# Altium footprint library 接插件封装库.PcbLib: 112 footprints (part 5 of 7)
Each footprint in its own frame and in the unit in brackets; x right, y up, seen from the top. Pads: shape width x height; smd on the part's side, far side on the other; paste and mask are expansions set on the pad; w line width, h text height; cw(c..) or ccw(c..) is an arc to the next point about the centre after c.
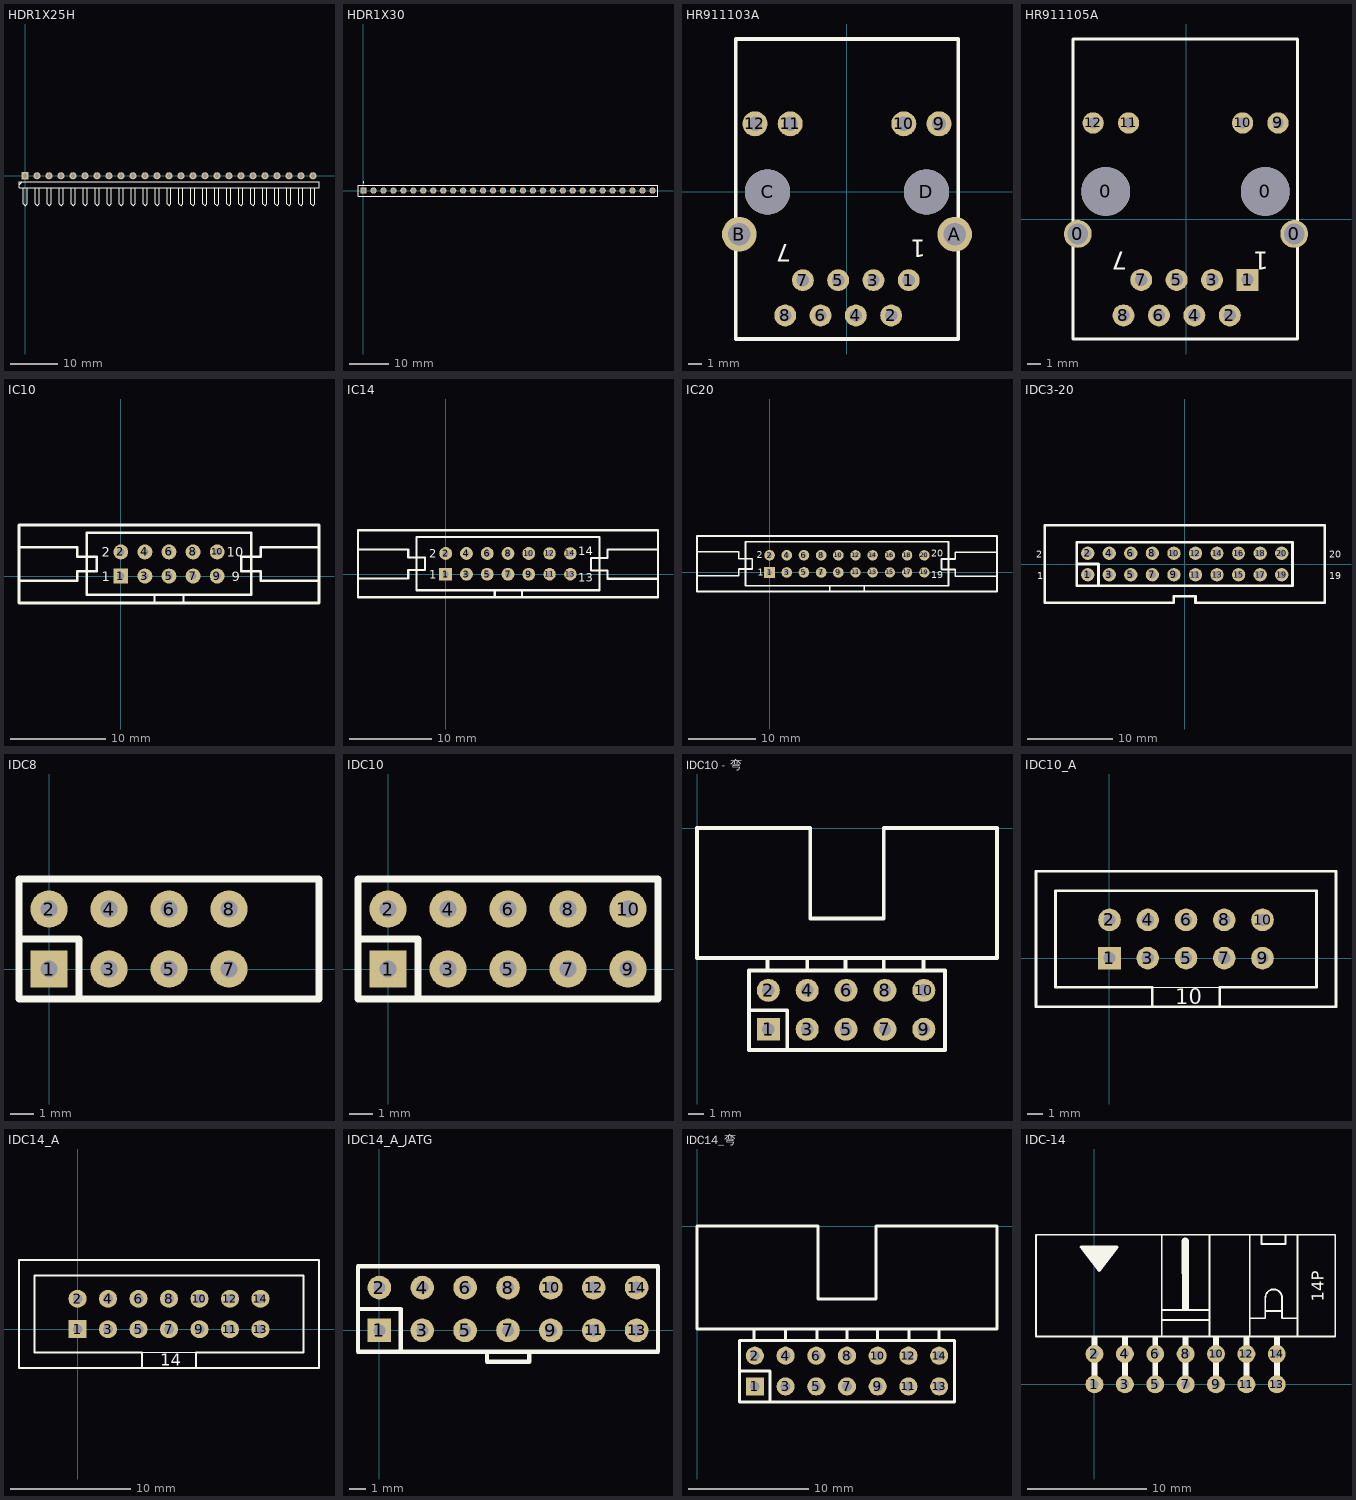
[diagram p4: the footprints below, top view; thin cyan lines are the x and y axes]

## HDR1X25H [mm] "Connector; Header; 25 Position; Right Angle"
pads (25):
  rect 1.5x1.5 hole 0.9: 1(0,0)
  round 1.5 hole 0.9: 2(2.54,0) 3(5.08,0) 4(7.62,0) 5(10.16,0) 6(12.7,0) 7(15.24,0) 8(17.78,0) 9(20.32,0) 10(22.86,0) 11(25.4,0) 12(27.94,0) 13(30.48,0) 14(33.02,0) 15(35.56,0) 16(38.1,0) 17(40.64,0) 18(43.18,0) 19(45.72,0) 20(48.26,0) 21(50.8,0) 22(53.34,0) 23(55.88,0) 24(58.42,0) 25(60.96,0)
Top Overlay:
  lines w0.2: -1.27,-1.905 -0.635,-1.27 ; -0.423,-2.54 -0.423,-5.927 0,-6.35 0.423,-5.927 0.423,-2.54 ; 2.117,-2.54 2.117,-5.927 2.54,-6.35 2.963,-5.927 2.963,-2.54 ; 4.657,-2.54 4.657,-5.927 5.08,-6.35 5.503,-5.927 5.503,-2.54 ; 7.197,-2.54 7.197,-5.927 7.62,-6.35 8.043,-5.927 8.043,-2.54 ; 9.737,-2.54 9.737,-5.927 10.16,-6.35 10.583,-5.927 10.583,-2.54 ; 12.277,-2.54 12.277,-5.927 12.7,-6.35 13.123,-5.927 13.123,-2.54 ; 14.817,-2.54 14.817,-5.927 15.24,-6.35 15.663,-5.927 15.663,-2.54 ; 17.357,-2.54 17.357,-5.927 17.78,-6.35 18.203,-5.927 18.203,-2.54 ; 19.897,-2.54 19.897,-5.927 20.32,-6.35 20.743,-5.927 20.743,-2.54 ; 22.437,-2.54 22.437,-5.927 22.86,-6.35 23.283,-5.927 23.283,-2.54 ; 24.977,-2.54 24.977,-5.927 25.4,-6.35 25.823,-5.927 25.823,-2.54 ; 27.517,-2.54 27.517,-5.927 27.94,-6.35 28.363,-5.927 28.363,-2.54 ; 30.057,-2.54 30.057,-5.927 30.48,-6.35 30.903,-5.927 30.903,-2.54 ; 32.597,-2.54 32.597,-5.927 33.02,-6.35 33.443,-5.927 33.443,-2.54 ; 35.137,-2.54 35.137,-5.927 35.56,-6.35 35.983,-5.927 35.983,-2.54 ; 37.677,-2.54 37.677,-5.927 38.1,-6.35 38.523,-5.927 38.523,-2.54 ; 40.217,-2.54 40.217,-5.927 40.64,-6.35 41.063,-5.927 41.063,-2.54 ; 42.757,-2.54 42.757,-5.927 43.18,-6.35 43.603,-5.927 43.603,-2.54 ; 45.297,-2.54 45.297,-5.927 45.72,-6.35 46.143,-5.927 46.143,-2.54 ; 47.837,-2.54 47.837,-5.927 48.26,-6.35 48.683,-5.927 48.683,-2.54 ; 50.377,-2.54 50.377,-5.927 50.8,-6.35 51.223,-5.927 51.223,-2.54 ; 52.917,-2.54 52.917,-5.927 53.34,-6.35 53.763,-5.927 53.763,-2.54 ; 55.457,-2.54 55.457,-5.927 55.88,-6.35 56.303,-5.927 56.303,-2.54 ; 57.997,-2.54 57.997,-5.927 58.42,-6.35 58.843,-5.927 58.843,-2.54 ; 60.537,-2.54 60.537,-5.927 60.96,-6.35 61.383,-5.927 61.383,-2.54 ; -1.27,-2.54 -1.27,-1.27 0.635,-1.27 62.23,-1.27 62.23,-2.54 -1.27,-2.54
3D body: height 2.54, standoff -1, extent -1.27,-10.001 62.23,0.349

## HDR1X30 [mm] "Connector; Header; 30 Position"
pads (30):
  rect 1.6x1.6 hole 0.99: 1(0,0)
  round 1.6 hole 0.99: 2(2.54,0) 3(5.08,0) 4(7.62,0) 5(10.16,0) 6(12.7,0) 7(15.24,0) 8(17.78,0) 9(20.32,0) 10(22.86,0) 11(25.4,0) 12(27.94,0) 13(30.48,0) 14(33.02,0) 15(35.56,0) 16(38.1,0) 17(40.64,0) 18(43.18,0) 19(45.72,0) 20(48.26,0) 21(50.8,0) 22(53.34,0) 23(55.88,0) 24(58.42,0) 25(60.96,0) 26(63.5,0) 27(66.04,0) 28(68.58,0) 29(71.12,0) 30(73.66,0)
Top Overlay:
  circle w0.25: c0,2.05 r0.125
  lines w0.2: -1.4,-1.4 -1.4,1.4 75.06,1.4 75.06,-1.4 -1.4,-1.4
3D body: height 8.54, standoff -3, extent -1.27,-1.27 74.93,1.27

## HR911103A [mil]
pads (16):
  round 62 hole 35: 1(175.17,-249.8) 2(125.17,-349.8) 3(75.17,-249.8) 4(25.17,-349.8) 5(-24.83,-249.8) 6(-74.83,-349.8) 7(-124.83,-249.8) 8(-174.83,-349.8)
  round 70.87 hole 40.16: 9(260.99,193.12) 10(160.99,193.12) 11(-160.66,193.12) 12(-260.66,193.12)
  round 98.42 hole 64.17: A(305.09,-119.87) B(-304.76,-119.87)
  round 127.95 hole 127.95: C(-224.83,0.2) D(225.17,0.2)
Top Overlay:
  lines w10: -314.8,-416.46 -314.8,433.28 315.13,433.28 315.13,-416.46 -314.8,-416.46
  text "1" at 223,-135.67 h50
  text "7" at -157.29,-148.73 h50

## HR911105A [mil]
height 78.35
pads (16):
  round 78.74 hole 59.06: 0(-305.37,-41.54) 0(305.37,-41.54)
  round 137.8 hole 137.8: 0(-226.44,78.54) 0(223.56,78.54)
  rect 62x62 hole 35: 1(173.56,-171.46)
  round 62 hole 35: 2(123.56,-271.46) 3(73.56,-171.46) 4(23.56,-271.46) 5(-26.44,-171.46) 6(-76.44,-271.46) 7(-126.44,-171.46) 8(-176.44,-271.46)
  round 60 hole 30: 9(259.59,271.46) 10(159.59,271.46) 11(-162.07,271.46) 12(-262.07,271.46)
Top Overlay:
  lines w8: -318.76,-338.12 315.1,-338.12 315.1,508.46 -318.76,508.46 -318.76,-338.12
  text "1" at 233.56,-91.46 h50
  text "7" at -166.44,-91.46 h50
3D body: height 539.37, standoff -157.48, extent -320,-341.26 309.92,501.26

## IC10 [mil]
pads (10):
  rect 62x62 hole 29.53: 1(0,0)
  round 62 hole 29.53: 2(0,100) 3(100,0) 4(100,100) 5(200,0) 6(200,100) 7(300,0) 8(300,100) 9(400,0) 10(400,100)
Top Overlay:
  lines w10: -422.05,-19.68 -180,-19.68 -180,20 -100,20 -100,60 -100,80 -180,80 -180,119.69 -422.05,119.69 ; 140,-111.42 140,-77.17 ; 260,-111.42 260,-77.17 ; 822.05,-19.68 580,-19.68 580,20 500,20 500,80 580,80 580,119.69 822.05,119.69 ; -140.55,-77.17 -140.55,178.74 540.55,178.74 540.55,-77.17 -140.55,-77.17
  lines w12: -422.05,-111.42 -422.05,211.42 822.05,211.42 822.05,-111.42 -422.05,-111.42
  text "1" at -79.8,-20.79 h40
  text "2" at -79.8,79.21 h40
  text "9" at 460.2,-20.79 h40
  text "10" at 440.2,79.21 h40

## IC14 [mil]
pads (14):
  rect 62x62 hole 29.53: 1(0,0)
  round 62 hole 29.53: 2(0,100) 3(100,0) 4(100,100) 5(200,0) 6(200,100) 7(300,0) 8(300,100) 9(400,0) 10(400,100)
  round 60 hole 29.53: 11(500,0) 12(500,100) 13(600,0) 14(600,100)
Top Overlay:
  lines w10: -422.05,-19.68 -180,-19.68 -180,20 -100,20 -100,60 -100,80 -180,80 -180,119.69 -422.05,119.69 ; 236.22,-112.99 236.22,-78.74 ; 368.11,-111.02 368.11,-76.77 ; 698.82,18.74 698.82,78.74 778.82,78.74 ; 699.53,17.72 779.53,17.72 ; 779.53,-21.65 779.53,18.03 ; 779.53,78.74 779.53,118.43 ; 779.53,118.11 1021.57,118.11 ; 779.61,-21.65 1021.65,-21.65 ; -140.55,-77.17 740.55,-77.17 740.55,178.74 -140.55,178.74 -140.55,-77.17
  lines w12: -422.05,-111.42 1022.05,-111.42 1022.05,211.42 -422.05,211.42 -422.05,-111.42
  text "14" at 637.8,92.52 h40
  text "13" at 637.8,-35.43 h40
  text "2" at -79.8,79.21 h40
  text "1" at -79.8,-20.79 h40

## IC20 [mil]
pads (20):
  rect 62x62 hole 29.53: 1(0,0)
  round 62 hole 29.53: 2(0,100) 3(100,0) 4(100,100) 5(200,0) 6(200,100) 7(300,0) 8(300,100) 9(400,0) 10(400,100)
  round 60 hole 29.53: 11(500,0) 12(500,100) 13(600,0) 14(600,100) 15(700,0) 16(700,100) 17(800,0) 18(800,100) 19(900,0) 20(900,100)
Top Overlay:
  lines w10: -422.05,-19.68 -180,-19.68 -180,20 -100,20 -100,60 -100,80 -180,80 -180,119.69 -422.05,119.69 ; 350.39,-112.99 350.39,-78.74 ; 551.18,-112.2 551.18,-77.95 ; 1000,18.74 1000,78.74 ; 1000.71,17.72 1080.71,17.72 ; 1000.71,78.74 1080.71,78.74 ; 1080.71,-21.65 1080.71,18.03 ; 1080.71,78.43 1080.71,118.11 ; 1080.79,-21.65 1322.83,-21.65 ; 1080.79,118.11 1322.83,118.11 ; -140.55,-77.17 1040.55,-77.17 1040.55,178.74 -140.55,178.74 -140.55,-77.17
  lines w12: -422.05,-111.42 1322.05,-111.42 1322.05,211.42 -422.05,211.42 -422.05,-111.42
  text "20" at 938.98,90.55 h40
  text "19" at 940.94,-33.46 h40
  text "2" at -74.8,82.68 h40
  text "1" at -68.9,-19.68 h40

## IDC3-20 [mil]
height 393.7
pads (20):
  round 62 hole 35.43: 1(-450,-50) 2(-450,50) 3(-350,-50) 4(-350,50) 5(-250,-50) 6(-250,50) 7(-150,-50) 8(-150,50) 9(-50,-50) 10(-50,50) 11(50,-50) 12(50,50) 13(150,-50) 15(250,-50) 17(350,-50) 18(350,50) 19(450,-50) 20(450,50)
  oval 59.06x62 / inner round 60 / far side round 60 hole 35.43: 14(150,50) 16(250,50)
Top Overlay:
  lines w12: -500,0 -400,0 -400,-100 ; -650,-180 -650,180 450,180 650,180 650,-180 211.61,-180 50,-180 50,-150 0,-150 -50,-150 -50,-180 -650,-180 ; -500,-100 300,-100 500,-100 500,100 300,100 -500,100 -500,-100
  text "1" at -685,-70 h32
  text "2" at -690,30 h32
  text "19" at 670,-70 h32
  text "20" at 670,30 h32
3D body: height 354.33, standoff -137.93, extent -650,-171.46 650,175

## IDC8 [mil]
pads (8):
  rect 62x62 hole 28: 1(0,0)
  round 62 hole 28: 2(0,100) 3(100,0) 4(100,100) 5(200,0) 6(200,100) 7(300,0) 8(300,100)
Top Overlay:
  lines w12: -50,50 50,50 50,-50 ; -50,-50 -50,150 450,150 450,-50 -50,-50

## IDC10 [mil]
pads (10):
  rect 62x62 hole 28: 1(0,0)
  round 62 hole 28: 2(0,100) 3(100,0) 4(100,100) 5(200,0) 6(200,100) 7(300,0) 8(300,100) 9(400,0) 10(400,100)
Top Overlay:
  lines w12: -50,50 50,50 50,-50 ; -50,-50 450,-50 450,150 -50,150 -50,-50

## IDC10 - 弯 [mm]
pads (10):
  rect 1.5x1.5 hole 0.8: 1(4.66,-13.14)
  round 1.5 hole 0.8: 2(4.66,-10.6) 3(7.2,-13.14) 4(7.2,-10.6) 5(9.74,-13.14) 6(9.74,-10.6) 7(12.28,-13.14) 8(12.28,-10.6) 9(14.82,-13.14) 10(14.82,-10.6)
Top Overlay:
  lines w0.25: 4.6,-9.3 4.6,-8.49 ; 7.2,-9.3 7.2,-8.49 ; 9.7,-9.3 9.7,-8.49 ; 12.2,-9.3 12.2,-8.49 ; 14.8,-9.3 14.8,-8.49 ; 0,-8.49 19.6,-8.49 19.6,0.01 12.2,0.01 12.2,-5.9 7.4,-5.9 7.4,0.01 0,0.01 0,-8.49
  lines w0.254: 3.4,-11.9 5.9,-11.9 5.9,-14.5 ; 5.9,-14.5 16.2,-14.5 16.2,-9.3 3.4,-9.3 3.4,-14.5 5.9,-14.5

## IDC10_A [mm]
pads (10):
  rect 1.5x1.5 hole 0.8: 1(0,0)
  round 1.5 hole 0.8: 2(0,2.54) 3(2.54,0) 4(2.54,2.54) 5(5.08,0) 6(5.08,2.54) 7(7.62,0) 8(7.62,2.54) 9(10.16,0) 10(10.16,2.54)
Top Overlay:
  lines w0.076: 2.83,-1.93 7.33,-1.93
  lines w0.178: 2.83,-3.22 2.83,-1.93 -3.58,-1.93 -3.58,4.47 13.74,4.47 13.74,-1.93 7.33,-1.93 7.33,-3.23 ; 7.33,-3.23 2.82,-3.23 -4.88,-3.23 -4.88,5.77 15.04,5.77 15.04,-3.23 7.33,-3.23
  text "10" at 4.37,-3.05 h1.02

## IDC14_A [mm]
pads (14):
  rect 1.5x1.5 hole 0.8: 1(0,0)
  round 1.5 hole 0.8: 2(0,2.54) 3(2.54,0) 4(2.54,2.54) 5(5.08,0) 6(5.08,2.54) 7(7.62,0) 8(7.62,2.54) 9(10.16,0) 10(10.16,2.54) 11(12.7,0) 12(12.7,2.54) 13(15.24,0) 14(15.24,2.54)
Top Overlay:
  lines w0.076: 5.37,-1.93 9.87,-1.93
  lines w0.178: 5.37,-3.22 5.37,-1.93 -3.58,-1.93 -3.58,4.47 18.82,4.47 18.82,-1.93 9.87,-1.93 9.87,-3.23 ; 9.87,-3.23 5.36,-3.23 -4.88,-3.23 -4.88,5.77 20.12,5.77 20.12,-3.23 9.87,-3.23
  text "14" at 6.91,-3.05 h1.02

## IDC14_A_JATG [mm]
pads (14):
  rect 1.4x1.4 hole 0.711: 1(0,0)
  round 1.4 hole 0.711: 2(0,2.54) 3(2.54,0) 4(2.54,2.54) 5(5.08,0) 6(5.08,2.54) 7(7.62,0) 8(7.62,2.54) 9(10.16,0) 10(10.16,2.54) 11(12.7,0) 12(12.7,2.54) 13(15.24,0) 14(15.24,2.54)
Top Overlay:
  lines w0.254: -1.27,1.27 1.27,1.27 1.27,-1.27 ; 6.374,-1.275 6.374,-1.865 8.879,-1.865 8.879,-1.27 ; -1.27,-1.27 16.51,-1.27 16.51,3.81 -1.27,3.81 -1.27,-1.27

## IDC14_弯 [mm]
pads (14):
  rect 1.5x1.5 hole 0.8: 1(4.77,-13.23)
  round 1.5 hole 0.8: 2(4.77,-10.69) 3(7.31,-13.23) 4(7.31,-10.69) 5(9.85,-13.23) 6(9.85,-10.69) 7(12.39,-13.23) 8(12.39,-10.69) 9(14.93,-13.23) 10(14.93,-10.69) 11(17.47,-13.23) 12(17.47,-10.69) 13(20.01,-13.23) 14(20.01,-10.69)
Top Overlay:
  lines w0.25: 4.7,-9.42 4.7,-8.48 ; 7.3,-9.42 7.3,-8.48 ; 9.9,-9.42 9.9,-8.48 ; 12.4,-9.42 12.4,-8.48 ; 14.9,-9.42 14.9,-8.48 ; 17.5,-9.42 17.5,-8.48 ; 20,-9.42 20,-8.48 ; -0.01,-8.48 -0.01,0.02 9.99,0.02 9.99,-6 14.79,-6 14.79,0.02 24.79,0.02 24.79,-8.48 -0.01,-8.48
  lines w0.254: 3.5,-11.96 6.04,-11.96 6.04,-14.5 ; 3.5,-14.5 3.5,-9.42 21.28,-9.42 21.28,-14.5 3.5,-14.5

## IDC-14 [mm]
pads (14):
  round 1.5 hole 0.711: 1(0,0) 2(0,2.54) 3(2.54,0) 4(2.54,2.54) 5(5.08,0) 6(5.08,2.54) 7(7.62,0) 8(7.62,2.54) 9(10.16,0) 10(10.16,2.54) 11(12.7,0) 12(12.7,2.54) 13(15.24,0) 14(15.24,2.54)
Top Overlay:
  lines w0.15: -4.89,12.508 20.127,12.508 20.127,4.001 14.023,4.001 ; -4.88,12.508 -4.88,4.001 7.62,4.001 17.627,4.001 ; 5.617,4.058 5.617,12.511 7.62,12.511 ; 5.643,6.211 9.523,6.211 ; 5.663,5.371 9.627,5.371 ; 7.62,12.501 9.627,12.501 9.627,4.028 ; 11.193,4.021 15.193,4.021 ; 12.973,12.451 12.973,4.031 12.973,5.531 14.283,5.531 14.283,6.131 15.683,6.131 ; 13.973,12.431 13.973,11.721 15.973,11.721 15.973,12.461 ; 14.283,6.121 14.283,7.221 cw(c14.983,7.241) 15.683,7.231 15.683,6.131 ; 16.973,4.011 16.973,12.431 ; 16.983,5.531 15.683,5.531 15.683,6.131
  lines w0.254: 7.433,6.301 7.433,6.641 ; 7.773,6.261 7.773,6.671 ; 15.123,3.591 15.123,3.971 ; 15.363,3.591 15.363,3.911 ; -1.107,11.501 0.393,9.501 1.893,11.501 -1.107,11.501
  lines w0.5: -0.667,11.231 1.503,11.221 ; -0.417,10.811 1.203,10.811 ; -0.077,10.391 0.883,10.391 ; 0,0 0,2.54 0,3.828 ; 0.223,9.961 0.563,9.961 ; 2.54,0 2.54,2.54 2.54,3.828 ; 5.08,0 5.08,2.54 5.08,3.828 ; 7.62,0 7.62,2.54 7.62,3.828 ; 10.16,0 10.16,2.54 10.16,3.828 ; 12.7,0 12.7,2.54 12.7,3.828 ; 15.24,0 15.24,2.54 15.24,3.828
  lines w0.6: 7.593,11.981 7.603,6.441
  text "14P" at 19.177,6.893 h1.02